# Altium footprint library Vowstar_Module.PcbLib: 57 footprints (part 1 of 4)
Each footprint in its own frame and in the unit in brackets; x right, y up, seen from the top. Pads: shape width x height; smd on the part's side, far side on the other; paste and mask are expansions set on the pad; w line width, h text height; cw(c..) or ccw(c..) is an arc to the next point about the centre after c.
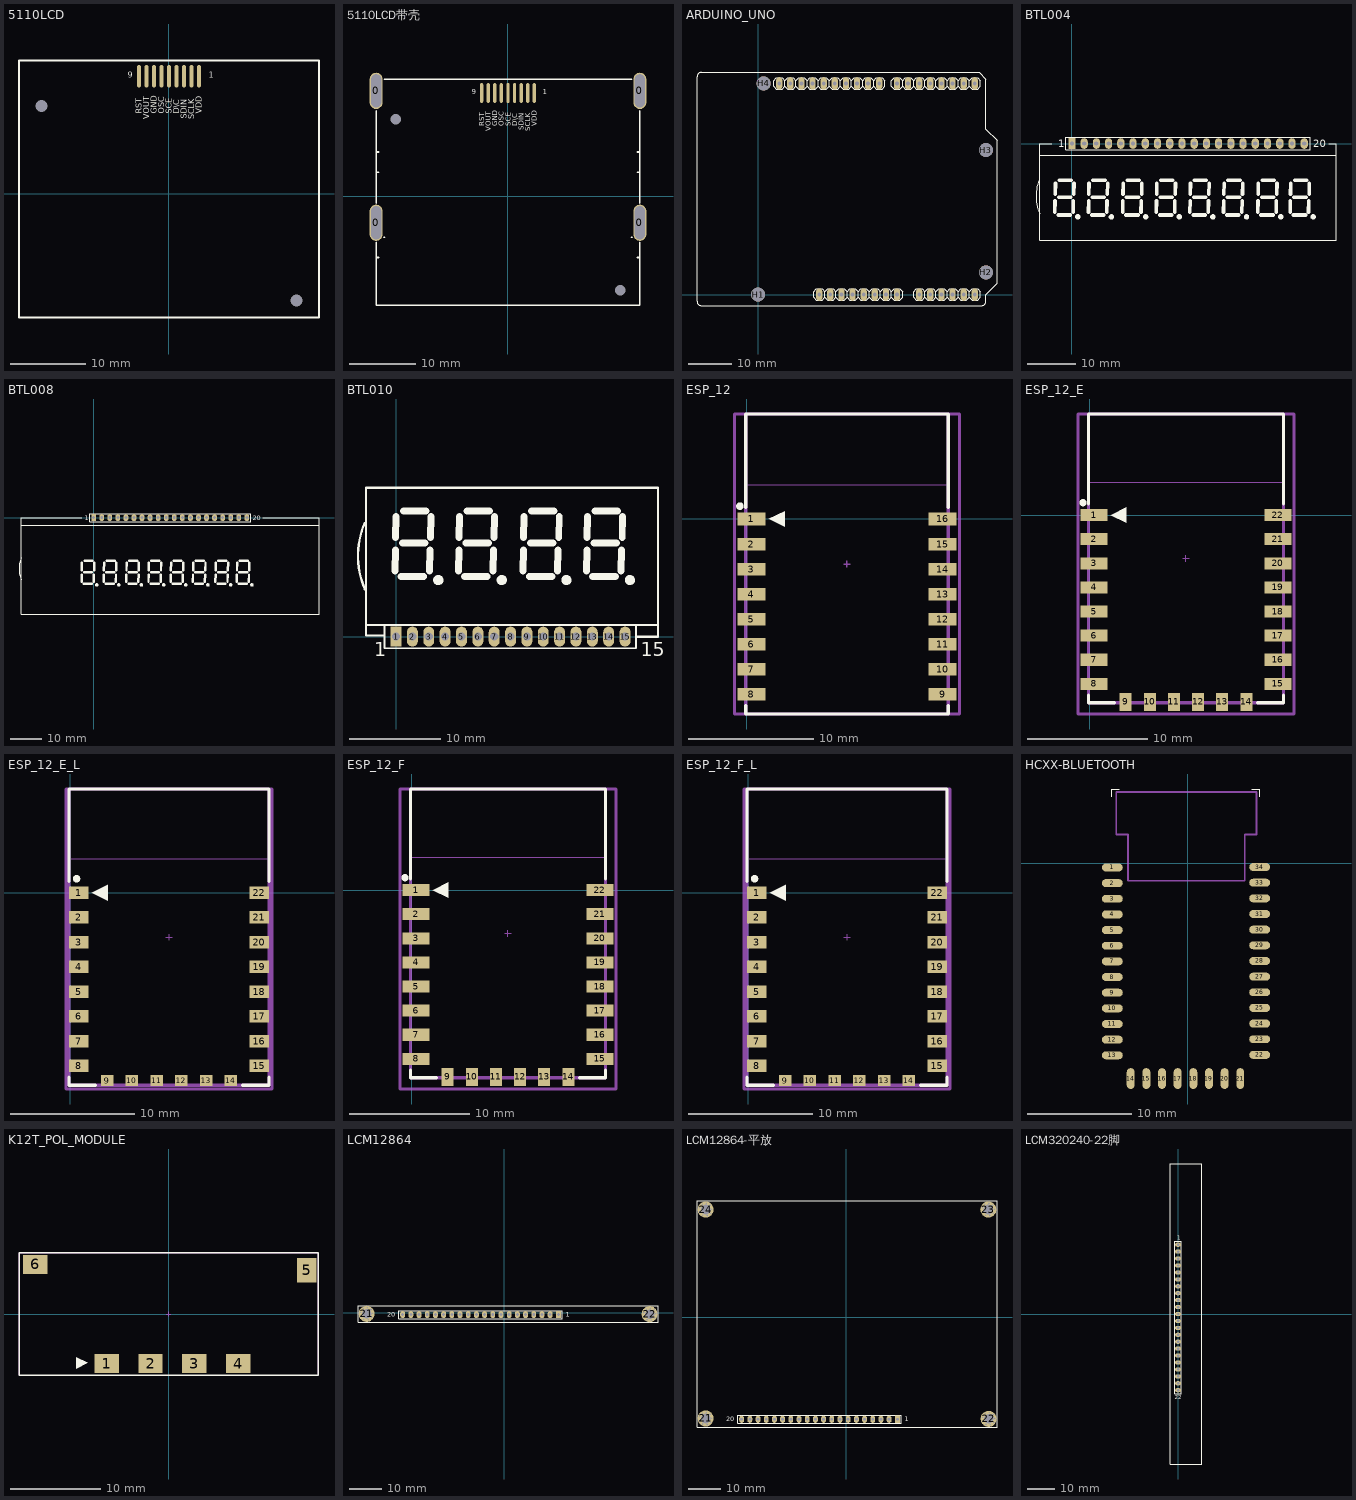
[diagram p0: the footprints below, top view; thin cyan lines are the x and y axes]

## 5110LCD [mm]
pads (11):
  round 0 on Mech1 hole 1.6: 0(-16.958,11.689) 0(17.06,-14.215)
  oval 0.5x3 smd: 1(4.06,15.685) 2(3.06,15.685) 3(2.06,15.685) 4(1.06,15.685) 5(0.06,15.685) 6(-0.94,15.685) 7(-1.94,15.685) 8(-2.94,15.685) 9(-3.94,15.685)
Top Overlay:
  lines w0.254: -19.94,-16.515 20.06,-16.515 20.06,17.785 -19.94,17.785 -19.94,-16.515
  text "9" at -5.461,15.494 h0.76
  text "1" at 5.334,15.494 h0.76
  text "RST" at -3.556,10.668 h0.76
  text "VOUT" at -2.556,9.906 h0.76
  text "GND" at -1.556,10.668 h0.76
  text "OSC" at -0.556,10.668 h0.76
  text "SCE" at 0.445,10.668 h0.76
  text "D\C" at 1.445,10.668 h0.76
  text "SDIN" at 2.445,10.033 h0.76
  text "SCLK" at 3.445,9.906 h0.76
  text "VDD" at 4.445,10.668 h0.76
3D body: height 2.8, standoff 0, extent -19.685,-16.256 19.812,17.526

## 5110LCD带壳 [mm]
pads (15):
  oval 2x5.5 hole 1.5 slot 5 at 90 deg: 0(-19.939,-3.998) 0(-19.939,16.002) 0(20.066,-3.998) 0(20.066,16.002)
  round 0 on Mech1 hole 1.6: 0(-16.958,11.689) 0(17.06,-14.215)
  oval 0.5x3 smd: 1(4.06,15.685) 2(3.06,15.685) 3(2.06,15.685) 4(1.06,15.685) 5(0.06,15.685) 6(-0.94,15.685) 7(-1.94,15.685) 8(-2.94,15.685) 9(-3.94,15.685)
Top Overlay:
  lines w0.254: -19.94,-6.985 -19.94,-16.515 20.06,-16.515 20.06,-6.985 ; -19.94,-1.016 -19.94,12.954 ; -19.939,-9.271 -19.558,-9.271 ; -19.939,3.683 -19.558,3.683 ; -19.939,6.731 -19.558,6.731 ; -18.796,-6.223 -18.669,-6.223 ; -18.669,17.78 18.796,17.78 ; 18.796,-6.223 18.923,-6.223 ; 19.685,-9.271 20.066,-9.271 ; 19.685,3.683 19.939,3.683 ; 19.685,6.731 19.939,6.731 ; 20.06,12.954 20.068,-1.016
  text "VDD" at 4.445,10.668 h0.76
  text "SCLK" at 3.445,9.906 h0.76
  text "SDIN" at 2.445,10.033 h0.76
  text "D\C" at 1.445,10.668 h0.76
  text "SCE" at 0.445,10.668 h0.76
  text "OSC" at -0.556,10.668 h0.76
  text "GND" at -1.556,10.668 h0.76
  text "VOUT" at -2.556,9.906 h0.76
  text "RST" at -3.556,10.668 h0.76
  text "1" at 5.334,15.494 h0.76
  text "9" at -5.461,15.494 h0.76
3D body: height 2.8, standoff 0, extent -19.685,-16.256 19.812,17.526

## ARDUINO_UNO [mil] "ARDUINO_UNO"
pads (36):
  oval 56x112 hole 34: AD1(1450,0) AD2(1550,0) AD3(1650,0) AD4(1750,0) AD5(1850,0) AD6(1950,0) IOH1(1090,1900) IOH2(990,1900) IOH3(890,1900) IOH4(790,1900) IOH5(690,1900) IOH6(590,1900) IOH7(490,1900) IOH8(390,1900) IOH9(290,1900) IOH10(190,1900) IOL1(1950,1900) IOL2(1850,1900) IOL3(1750,1900) IOL4(1650,1900) IOL5(1550,1900) IOL6(1450,1900) IOL7(1350,1900) IOL8(1250,1900) POW1(550,0) POW2(650,0) POW3(750,0) POW4(850,0) POW5(950,0) POW6(1050,0) POW7(1150,0) POW8(1250,0)
  round 126 hole 126: H1(0,0) H2(2050,200) H3(2050,1300) H4(50,1900)
Top Overlay:
  drawing of 240 lines, arcs and shapes, not listed

## BTL004 [mm] "BTL004"
height 2.8
pads (20):
  rect 1.5x2.2 hole 0.9: 1(0,0)
  oval 1.5x2.2 hole 0.9: 2(2.54,0) 3(5.08,0) 4(7.62,0) 5(10.16,0) 6(12.7,0) 7(15.24,0) 8(17.78,0) 9(20.32,0) 10(22.86,0) 11(25.4,0) 12(27.94,0) 13(30.48,0) 14(33.02,0) 15(35.56,0) 16(38.1,0) 17(40.64,0) 18(43.18,0) 19(45.72,0) 20(48.26,0)
Top Overlay:
  circle w1.016: c50.114,-15.24 r0.051
  circle w1.016: c43.383,-15.24 r0.051
  circle w1.016: c36.271,-15.24 r0.051
  circle w1.016: c29.286,-15.24 r0.051
  circle w1.016: c22.301,-15.24 r0.051
  circle w1.016: c15.316,-15.24 r0.051
  circle w1.016: c8.204,-15.24 r0.051
  circle w1.016: c1.219,-15.24 r0.051
  lines w0.2: -1.27,-1.27 49.53,-1.27 49.53,1.27 0.635,1.27 -1.27,1.27 -1.27,-1.27
  lines w0.254: -6.813,-7.52 ccw(c1.77,-10.929) -6.713,-14.58 ; -6.731,-2.413 54.864,-2.413 ; -4.191,0 -6.731,0 -6.731,-20.066 54.864,-20.066 54.864,0 53.34,0
  lines w0.762: -3.556,-14.224 -3.505,-11.938 ; -3.48,-10.541 -3.429,-8.255 ; -2.87,-14.859 -0.381,-14.859 ; -2.743,-11.176 -0.254,-11.176 ; -2.616,-7.62 -0.127,-7.62 ; 0.254,-14.224 0.305,-11.938 ; 0.381,-10.541 0.432,-8.255 ; 3.429,-14.224 3.48,-11.938 ; 3.505,-10.541 3.556,-8.255 ; 4.115,-14.859 6.604,-14.859 ; 4.242,-11.176 6.731,-11.176 ; 4.369,-7.62 6.858,-7.62 ; 7.239,-14.224 7.29,-11.938 ; 7.366,-10.541 7.417,-8.255 ; 10.541,-14.224 10.592,-11.938 ; 10.617,-10.541 10.668,-8.255 ; 11.227,-14.859 13.716,-14.859 ; 11.354,-11.176 13.843,-11.176 ; 11.481,-7.62 13.97,-7.62 ; 14.351,-14.224 14.402,-11.938 ; 14.478,-10.541 14.529,-8.255 ; 17.526,-14.224 17.577,-11.938 ; 17.602,-10.541 17.653,-8.255 ; 18.212,-14.859 20.701,-14.859 ; 18.339,-11.176 20.828,-11.176 ; 18.466,-7.62 20.955,-7.62 ; 21.336,-14.224 21.387,-11.938 ; 21.463,-10.541 21.514,-8.255 ; 24.511,-14.224 24.562,-11.938 ; 24.587,-10.541 24.638,-8.255 ; 25.197,-14.859 27.686,-14.859 ; 25.324,-11.176 27.813,-11.176 ; 25.451,-7.62 27.94,-7.62 ; 28.321,-14.224 28.372,-11.938 ; 28.448,-10.541 28.499,-8.255 ; 31.496,-14.224 31.547,-11.938 ; 31.572,-10.541 31.623,-8.255 ; 32.182,-14.859 34.671,-14.859 ; 32.309,-11.176 34.798,-11.176 ; 32.436,-7.62 34.925,-7.62 ; 35.306,-14.224 35.357,-11.938 ; 35.433,-10.541 35.484,-8.255 ; 38.608,-14.224 38.659,-11.938 ; 38.684,-10.541 38.735,-8.255 ; 39.294,-14.859 41.783,-14.859 ; 39.421,-11.176 41.91,-11.176 ; 39.548,-7.62 42.037,-7.62 ; 42.418,-14.224 42.469,-11.938 ; 42.545,-10.541 42.596,-8.255 ; 45.339,-14.224 45.39,-11.938 ; 45.415,-10.541 45.466,-8.255 ; 46.025,-14.859 48.514,-14.859 ; 46.152,-11.176 48.641,-11.176 ; 46.279,-7.62 48.768,-7.62 ; 49.149,-14.224 49.2,-11.938 ; 49.276,-10.541 49.327,-8.255
  text "1" at -2.794,-0.762 h1.52
  text "20" at 50.165,-0.762 h1.52
3D body: height 2.4, standoff 0.4, extent -7.493,-14.224 -6.731,-7.747
3D body: height 2, standoff 0, extent -6.731,-2.413 54.864,0
3D body: height 2.8, standoff 0, extent -6.731,-20.193 54.864,-2.413

## BTL008 [mm]
pads (20):
  rect 1.5x2.2 hole 0.9: 1(0,0)
  oval 1.5x2.2 hole 0.9: 2(2.54,0) 3(5.08,0) 4(7.62,0) 5(10.16,0) 6(12.7,0) 7(15.24,0) 8(17.78,0) 9(20.32,0) 10(22.86,0) 11(25.4,0) 12(27.94,0) 13(30.48,0) 14(33.02,0) 15(35.56,0) 16(38.1,0) 17(40.64,0) 18(43.18,0) 19(45.72,0) 20(48.26,0)
Top Overlay:
  circle w1.016: c49.86,-21.209 r0.051
  circle w1.016: c43.129,-21.209 r0.051
  circle w1.016: c36.017,-21.209 r0.051
  circle w1.016: c29.032,-21.209 r0.051
  circle w1.016: c22.047,-21.209 r0.051
  circle w1.016: c15.062,-21.209 r0.051
  circle w1.016: c7.95,-21.209 r0.051
  circle w1.016: c0.965,-21.209 r0.051
  lines w0.2: -1.27,-1.27 49.53,-1.27 49.53,1.27 0.635,1.27 -1.27,1.27 -1.27,-1.27
  lines w0.254: -22.86,-12.573 ccw(c-14.277,-15.982) -22.76,-19.633 ; -22.733,-2.413 70.866,-2.413 ; -3.81,0 -22.733,0 -22.733,-30.48 70.993,-30.48 70.993,0 53.34,0
  lines w0.762: -3.81,-20.193 -3.759,-17.907 ; -3.734,-16.51 -3.683,-14.224 ; -3.124,-20.828 -0.635,-20.828 ; -2.997,-17.145 -0.508,-17.145 ; -2.87,-13.589 -0.381,-13.589 ; 0,-20.193 0.051,-17.907 ; 0.127,-16.51 0.178,-14.224 ; 3.175,-20.193 3.226,-17.907 ; 3.251,-16.51 3.302,-14.224 ; 3.861,-20.828 6.35,-20.828 ; 3.988,-17.145 6.477,-17.145 ; 4.115,-13.589 6.604,-13.589 ; 6.985,-20.193 7.036,-17.907 ; 7.112,-16.51 7.163,-14.224 ; 10.287,-20.193 10.338,-17.907 ; 10.363,-16.51 10.414,-14.224 ; 10.973,-20.828 13.462,-20.828 ; 11.1,-17.145 13.589,-17.145 ; 11.227,-13.589 13.716,-13.589 ; 14.097,-20.193 14.148,-17.907 ; 14.224,-16.51 14.275,-14.224 ; 17.272,-20.193 17.323,-17.907 ; 17.348,-16.51 17.399,-14.224 ; 17.958,-20.828 20.447,-20.828 ; 18.085,-17.145 20.574,-17.145 ; 18.212,-13.589 20.701,-13.589 ; 21.082,-20.193 21.133,-17.907 ; 21.209,-16.51 21.26,-14.224 ; 24.257,-20.193 24.308,-17.907 ; 24.333,-16.51 24.384,-14.224 ; 24.943,-20.828 27.432,-20.828 ; 25.07,-17.145 27.559,-17.145 ; 25.197,-13.589 27.686,-13.589 ; 28.067,-20.193 28.118,-17.907 ; 28.194,-16.51 28.245,-14.224 ; 31.242,-20.193 31.293,-17.907 ; 31.318,-16.51 31.369,-14.224 ; 31.928,-20.828 34.417,-20.828 ; 32.055,-17.145 34.544,-17.145 ; 32.182,-13.589 34.671,-13.589 ; 35.052,-20.193 35.103,-17.907 ; 35.179,-16.51 35.23,-14.224 ; 38.354,-20.193 38.405,-17.907 ; 38.43,-16.51 38.481,-14.224 ; 39.04,-20.828 41.529,-20.828 ; 39.167,-17.145 41.656,-17.145 ; 39.294,-13.589 41.783,-13.589 ; 42.164,-20.193 42.215,-17.907 ; 42.291,-16.51 42.342,-14.224 ; 45.085,-20.193 45.136,-17.907 ; 45.161,-16.51 45.212,-14.224 ; 45.771,-20.828 48.26,-20.828 ; 45.898,-17.145 48.387,-17.145 ; 46.025,-13.589 48.514,-13.589 ; 48.895,-20.193 48.946,-17.907 ; 49.022,-16.51 49.073,-14.224
  text "1" at -2.794,-0.762 h1.52
  text "20" at 50.165,-0.762 h1.52
3D body: height 2.4, standoff 0.4, extent -23.368,-19.812 -22.606,-13.335
3D body: height 2, standoff 0, extent -22.606,-2.413 70.993,0
3D body: height 2.8, standoff 0, extent -22.733,-30.449 70.739,-2.286

## BTL010 [mm] "BTL010"
height 2.8
pads (15):
  rect 1.2x2.2 hole 0.9: 1(0,0)
  oval 1.2x2.2 hole 0.9: 2(1.8,0) 3(3.6,0) 4(5.4,0) 5(7.2,0) 6(9,0) 7(10.8,0) 8(12.6,0) 9(14.4,0) 10(16.2,0) 11(18,0) 12(19.8,0) 13(21.6,0) 14(23.4,0) 15(25.2,0)
Top Overlay:
  circle w1.016: c4.648,6.223 r0.051
  circle w1.016: c11.633,6.223 r0.051
  circle w1.016: c18.745,6.223 r0.051
  circle w1.016: c25.73,6.223 r0.051
  lines w0.2: -1.27,-1.27 -1.27,1.27 0.635,1.27 26.416,1.27 26.416,-1.27 -1.27,-1.27
  lines w0.254: -3.452,12.51 ccw(c5.072,8.883) -3.437,5.221 ; -3.302,1.397 -3.302,0.127 -1.27,0.127 ; 26.543,0 28.829,0 28.829,1.27 ; 28.829,1.27 -3.302,1.27 -3.302,16.383 28.829,16.383 28.829,1.27
  lines w0.762: -0.127,7.239 -0.076,9.525 ; -0.051,10.922 0,13.208 ; 0.559,6.604 3.048,6.604 ; 0.686,10.287 3.175,10.287 ; 0.813,13.843 3.302,13.843 ; 3.683,7.239 3.734,9.525 ; 3.81,10.922 3.861,13.208 ; 6.858,7.239 6.909,9.525 ; 6.934,10.922 6.985,13.208 ; 7.544,6.604 10.033,6.604 ; 7.671,10.287 10.16,10.287 ; 7.798,13.843 10.287,13.843 ; 10.668,7.239 10.719,9.525 ; 10.795,10.922 10.846,13.208 ; 13.97,7.239 14.021,9.525 ; 14.046,10.922 14.097,13.208 ; 14.656,6.604 17.145,6.604 ; 14.783,10.287 17.272,10.287 ; 14.91,13.843 17.399,13.843 ; 17.78,7.239 17.831,9.525 ; 17.907,10.922 17.958,13.208 ; 20.955,7.239 21.006,9.525 ; 21.031,10.922 21.082,13.208 ; 21.641,6.604 24.13,6.604 ; 21.768,10.287 24.257,10.287 ; 21.895,13.843 24.384,13.843 ; 24.765,7.239 24.816,9.525 ; 24.892,10.922 24.943,13.208
  text "15" at 26.924,-2.159 h1.52
  text "1" at -2.413,-2.159 h1.52
3D body: height 2.8, standoff 0, extent -3.302,1.27 28.829,16.383
3D body: height 2.4, standoff 0.4, extent -4.191,5.588 -3.429,12.065
3D body: height 2, standoff 0, extent -3.429,0 28.829,1.333

## ESP_12 [mm] "ESP-12 Wi-Fi Module by AI-Thinker"
height 3.2
pads (16):
  rect 2.25x1 smd: 1(0.375,0) 2(0.375,-2) 3(0.375,-4) 4(0.375,-6) 5(0.375,-8) 6(0.375,-10) 7(0.375,-12) 8(0.375,-14) 9(15.625,-14) 10(15.625,-12) 11(15.625,-10) 12(15.625,-8) 13(15.625,-6) 14(15.625,-4) 15(15.625,-2) 16(15.625,0)
Top Overlay:
  circle w0.3: c-0.55,1.025 r0.15
  region: 1.77,0 3.04,-0.635 3.04,0.635
  lines w0.254: -0.084,-14.916 -0.084,-15.568 16.084,-15.568 16.084,-14.916 ; -0.084,0.916 -0.084,8.371 16.084,8.371 16.084,0.916
Mechanical 13:
  lines w0.051: -0.127,2.727 -0.127,8.382 16.129,8.382 16.129,2.727 -0.127,2.727
  lines w0.254: -0.084,-15.568 16.084,-15.568 16.084,8.371 -0.084,8.371 -0.084,-15.568
  text "CUTOUT POLYGON" at 0.127,7.366 h0.25
  text "ANTENNA AREA" at 0.127,7.874 h0.25
Mechanical 15:
  lines w0.1: 7.746,-3.598 8.254,-3.598 ; 8,-3.852 8,-3.344
  lines w0.254: -0.975,-15.568 -0.975,8.371 16.975,8.371 16.975,-15.568 -0.975,-15.568
3D body "ESP_12_E.STEP": height 2.75, standoff 0.04, extent 0.001,-15.491 16.001,8.509

## ESP_12_E [mm] "ESP-12 Wi-Fi Module by AI-Thinker"
height 3.2
pads (22):
  rect 2.25x1 smd: 1(0.375,0) 2(0.375,-2) 3(0.375,-4) 4(0.375,-6) 5(0.375,-8) 6(0.375,-10) 7(0.375,-12) 8(0.375,-14) 15(15.625,-14) 16(15.625,-12) 17(15.625,-10) 18(15.625,-8) 19(15.625,-6) 20(15.625,-4) 21(15.625,-2) 22(15.625,0)
  rect 1x1.5 smd: 9(3,-15.5) 10(5,-15.5) 11(7,-15.5) 12(9,-15.5) 13(11,-15.5) 14(13,-15.5)
Top Overlay:
  circle w0.3: c-0.55,1.025 r0.15
  region: 1.77,0 3.04,-0.635 3.04,0.635
  lines w0.254: -0.084,-14.916 -0.084,-15.568 2.068,-15.568 ; -0.084,0.916 -0.084,8.371 16.084,8.371 16.084,0.916 ; 13.932,-15.568 16.084,-15.568 16.084,-14.916
Mechanical 13:
  lines w0.051: -0.127,2.727 16.129,2.727 16.129,8.382 -0.127,8.382 -0.127,2.727
  lines w0.254: -0.084,-15.568 -0.084,8.371 16.084,8.371 16.084,-15.568 -0.084,-15.568
  text "ANTENNA AREA" at 0.127,7.874 h0.25
  text "CUTOUT POLYGON" at 0.127,7.366 h0.25
Mechanical 15:
  lines w0.1: 7.746,-3.598 8.254,-3.598 ; 8,-3.852 8,-3.344
  lines w0.254: -0.975,-16.5 16.975,-16.5 16.975,8.371 -0.975,8.371 -0.975,-16.5
3D body "ESP_12_E.STEP": height 2.75, standoff 0.04, extent 0.001,-15.491 16.001,8.509

## ESP_12_E_L [mm] "ESP-12 Wi-Fi Module by AI-Thinker"
height 3.2
pads (22):
  rect 1.6x1 smd: 1(0.7,0) 2(0.7,-2) 3(0.7,-4) 4(0.7,-6) 5(0.7,-8) 6(0.7,-10) 7(0.7,-12) 8(0.7,-14) 15(15.3,-14) 16(15.3,-12) 17(15.3,-10) 18(15.3,-8) 19(15.3,-6) 20(15.3,-4) 21(15.3,-2) 22(15.3,0)
  rect 1x0.9 smd: 9(3,-15.2) 10(5,-15.2) 11(7,-15.2) 12(9,-15.2) 13(11,-15.2) 14(13,-15.2)
Top Overlay:
  circle w0.3: c0.525,1.125 r0.15
  region: 1.77,0 3.04,-0.635 3.04,0.635
  lines w0.254: -0.084,-14.916 -0.084,-15.568 2.068,-15.568 ; -0.084,0.916 -0.084,8.371 16.084,8.371 16.084,0.916 ; 13.932,-15.568 16.084,-15.568 16.084,-14.916
Mechanical 13:
  lines w0.051: -0.127,2.727 16.129,2.727 16.129,8.382 -0.127,8.382 -0.127,2.727
  lines w0.254: -0.084,-15.568 -0.084,8.371 16.084,8.371 16.084,-15.568 -0.084,-15.568
  text "ANTENNA AREA" at 0.127,7.874 h0.25
  text "CUTOUT POLYGON" at 0.127,7.366 h0.25
Mechanical 15:
  lines w0.1: 7.746,-3.598 8.254,-3.598 ; 8,-3.852 8,-3.344
  lines w0.254: -0.325,-15.875 16.325,-15.875 16.325,8.371 -0.325,8.371 -0.325,-15.875
3D body "ESP_12_E.STEP": height 2.75, standoff 0.04, extent 0.001,-15.491 16.001,8.509

## ESP_12_F [mm] "ESP-12 Wi-Fi Module by AI-Thinker"
height 3.2
pads (22):
  rect 2.25x1 smd: 1(0.375,0) 2(0.375,-2) 3(0.375,-4) 4(0.375,-6) 5(0.375,-8) 6(0.375,-10) 7(0.375,-12) 8(0.375,-14) 15(15.625,-14) 16(15.625,-12) 17(15.625,-10) 18(15.625,-8) 19(15.625,-6) 20(15.625,-4) 21(15.625,-2) 22(15.625,0)
  rect 1x1.5 smd: 9(3,-15.5) 10(5,-15.5) 11(7,-15.5) 12(9,-15.5) 13(11,-15.5) 14(13,-15.5)
Top Overlay:
  circle w0.3: c-0.55,1.025 r0.15
  region: 1.77,0 3.04,-0.635 3.04,0.635
  lines w0.254: -0.084,-14.916 -0.084,-15.568 2.068,-15.568 ; -0.084,0.916 -0.084,8.371 16.084,8.371 16.084,0.916 ; 13.932,-15.568 16.084,-15.568 16.084,-14.916
Mechanical 13:
  lines w0.051: -0.127,2.727 16.129,2.727 16.129,8.382 -0.127,8.382 -0.127,2.727
  lines w0.254: -0.084,-15.568 -0.084,8.371 16.084,8.371 16.084,-15.568 -0.084,-15.568
  text "ANTENNA AREA" at 0.127,7.874 h0.25
  text "CUTOUT POLYGON" at 0.127,7.366 h0.25
Mechanical 15:
  lines w0.1: 7.746,-3.598 8.254,-3.598 ; 8,-3.852 8,-3.344
  lines w0.254: -0.975,-16.5 16.975,-16.5 16.975,8.371 -0.975,8.371 -0.975,-16.5
3D body "ESP_12_F.STEP": height 2.65, standoff -0.06, extent 0,-15.581 16,8.419

## ESP_12_F_L [mm] "ESP-12 Wi-Fi Module by AI-Thinker"
height 3.2
pads (22):
  rect 1.6x1 smd: 1(0.7,0) 2(0.7,-2) 3(0.7,-4) 4(0.7,-6) 5(0.7,-8) 6(0.7,-10) 7(0.7,-12) 8(0.7,-14) 15(15.3,-14) 16(15.3,-12) 17(15.3,-10) 18(15.3,-8) 19(15.3,-6) 20(15.3,-4) 21(15.3,-2) 22(15.3,0)
  rect 1x0.9 smd: 9(3,-15.2) 10(5,-15.2) 11(7,-15.2) 12(9,-15.2) 13(11,-15.2) 14(13,-15.2)
Top Overlay:
  circle w0.3: c0.525,1.125 r0.15
  region: 1.77,0 3.04,-0.635 3.04,0.635
  lines w0.254: -0.084,-14.916 -0.084,-15.568 2.068,-15.568 ; -0.084,0.916 -0.084,8.371 16.084,8.371 16.084,0.916 ; 13.932,-15.568 16.084,-15.568 16.084,-14.916
Mechanical 13:
  lines w0.051: -0.127,2.727 16.129,2.727 16.129,8.382 -0.127,8.382 -0.127,2.727
  lines w0.254: -0.084,-15.568 -0.084,8.371 16.084,8.371 16.084,-15.568 -0.084,-15.568
  text "ANTENNA AREA" at 0.127,7.874 h0.25
  text "CUTOUT POLYGON" at 0.127,7.366 h0.25
Mechanical 15:
  lines w0.1: 7.746,-3.598 8.254,-3.598 ; 8,-3.852 8,-3.344
  lines w0.254: -0.325,-15.875 16.325,-15.875 16.325,8.371 -0.325,8.371 -0.325,-15.875
3D body "ESP_12_F.STEP": height 2.65, standoff -0.06, extent 0,-15.581 16,8.419

## HCXX-BLUETOOTH [mm] "HCXX-BLUETOOTH"
pads (34):
  oval 2x0.76 smd: 1(-7.229,-0.381) 2(-7.229,-1.881) 3(-7.229,-3.381) 4(-7.229,-4.881) 5(-7.229,-6.381) 6(-7.229,-7.881) 7(-7.229,-9.381) 8(-7.229,-10.881) 9(-7.229,-12.381) 10(-7.229,-13.881) 11(-7.229,-15.381) 12(-7.229,-16.881) 13(-7.229,-18.381) 22(6.891,-18.341) 23(6.891,-16.841) 24(6.891,-15.341) 25(6.891,-13.841) 26(6.891,-12.341) 27(6.891,-10.841) 28(6.891,-9.341) 29(6.891,-7.841) 30(6.891,-6.341) 31(6.891,-4.841) 32(6.891,-3.341) 33(6.891,-1.841) 34(6.891,-0.341)
  oval 0.76x2 smd: 14(-5.469,-20.611) 15(-3.969,-20.611) 16(-2.469,-20.611) 17(-0.969,-20.611) 18(0.531,-20.611) 19(2.031,-20.611) 20(3.531,-20.611) 21(5.031,-20.611)
Top Overlay:
  lines w0.1: -7.299,6.389 -7.299,7.139 -6.549,7.139 ; 6.151,7.139 6.901,7.139 6.901,6.389
Mechanical 13:
  lines w0.178: -6.858,2.794 -6.858,6.858 6.604,6.858 6.604,2.794 5.461,2.794 5.461,-1.651 -5.715,-1.651 -5.715,2.794 -6.858,2.794

## K12T_POL_MODULE [mm] "Non-isolated voltage regulator single 10/16A output, POL module power supply"
height 8.3
pads (6):
  rect 2.7x2.1 smd: 1(-6.82,-5.47) 2(-1.99,-5.47) 3(2.84,-5.47) 4(7.67,-5.47) 6(-14.7,5.47)
  rect 2.1x2.7 smd: 5(15.25,4.81)
Top Overlay:
  region: -8.89,-5.397 -10.16,-4.763 -10.16,-6.032
  lines w0.152: -16.5,-6.75 16.5,-6.75 16.5,6.75 -16.5,6.75 -16.5,-6.75
Mechanical 13:
  lines w0.1: -16.5,-6.75 16.5,-6.75 16.5,6.75 -16.5,6.75 -16.5,-6.75
Mechanical 15:
  lines w0.1: -0.25,0 0.25,0 ; 0,-0.25 0,0.25 ; -16.5,-6.75 -16.5,6.75 16.5,6.75 16.5,-6.75 -16.5,-6.75
3D body "K12T-16A.STEP": height 8.3, standoff 0, extent -16.5,-6.75 16.5,6.75

## LCM12864 [mm] "LCM12864"
pads (22):
  rect 1.5x2.2 hole 0.9: 1(16.764,-0.508)
  oval 1.5x2.2 hole 0.9: 2(14.224,-0.508) 3(11.684,-0.508) 4(9.144,-0.508) 5(6.604,-0.508) 6(4.064,-0.508) 7(1.524,-0.508) 8(-1.016,-0.508) 9(-3.556,-0.508) 10(-6.096,-0.508) 11(-8.636,-0.508) 12(-11.176,-0.508) 13(-13.716,-0.508) 14(-16.256,-0.508) 15(-18.796,-0.508) 16(-21.336,-0.508) 17(-23.876,-0.508) 18(-26.416,-0.508) 19(-28.956,-0.508) 20(-31.496,-0.508)
  round 5 hole 3: 21(-42.672,-0.254) 22(45.085,-0.381)
via 46.626,-1.508 diameter 0.7 hole 0.5
via 45.541,-2.235 diameter 0.7 hole 0.5
via 44.242,-2.094 diameter 0.7 hole 0.5
via 43.338,-1.152 diameter 0.7 hole 0.5
via 43.251,0.151 diameter 0.7 hole 0.5
via 44.023,1.205 diameter 0.7 hole 0.5
via 45.291,1.517 diameter 0.7 hole 0.5
via 46.463,0.941 diameter 0.7 hole 0.5
via 46.99,-0.254 diameter 0.7 hole 0.5
via -40.767,-0.127 diameter 0.7 hole 0.5
via -41.294,1.068 diameter 0.7 hole 0.5
via -42.466,1.644 diameter 0.7 hole 0.5
via -43.734,1.332 diameter 0.7 hole 0.5
via -44.506,0.278 diameter 0.7 hole 0.5
via -44.419,-1.025 diameter 0.7 hole 0.5
via -43.515,-1.967 diameter 0.7 hole 0.5
via -42.216,-2.108 diameter 0.7 hole 0.5
via -41.131,-1.381 diameter 0.7 hole 0.5
Top Overlay:
  lines w0.2: -32.766,-1.778 -32.766,0.762 18.034,0.762 18.034,-1.778 16.129,-1.778 -32.766,-1.778
  lines w0.254: -45.339,-2.921 -45.339,2.286 47.661,2.286 47.661,-2.921 -45.339,-2.921
  text "1" at 19.05,-1.143 h1.52
  text "20" at -36.195,-1.143 h1.52

## LCM12864-平放 [mm] "LCM12864-平放"
pads (24):
  rect 1.5x2.2 hole 0.9: 1(15.875,-31.623)
  oval 1.5x2.2 hole 0.9: 2(13.335,-31.623) 3(10.795,-31.623) 4(8.255,-31.623) 5(5.715,-31.623) 6(3.175,-31.623) 7(0.635,-31.623) 8(-1.905,-31.623) 9(-4.445,-31.623) 10(-6.985,-31.623) 11(-9.525,-31.623) 12(-12.065,-31.623) 13(-14.605,-31.623) 14(-17.145,-31.623) 15(-19.685,-31.623) 16(-22.225,-31.623) 17(-24.765,-31.623) 18(-27.305,-31.623) 19(-29.845,-31.623) 20(-32.385,-31.623)
  round 5 hole 3: 21(-43.561,-31.369) 22(44.196,-31.496) 23(44.069,33.401) 24(-43.561,33.401)
via -42.02,-32.496 diameter 0.7 hole 0.5
via -43.105,-33.223 diameter 0.7 hole 0.5
via -44.404,-33.082 diameter 0.7 hole 0.5
via -45.308,-32.14 diameter 0.7 hole 0.5
via -45.395,-30.837 diameter 0.7 hole 0.5
via -44.623,-29.783 diameter 0.7 hole 0.5
via -43.355,-29.471 diameter 0.7 hole 0.5
via -42.183,-30.047 diameter 0.7 hole 0.5
via -41.656,-31.242 diameter 0.7 hole 0.5
via 46.101,-31.369 diameter 0.7 hole 0.5
via 45.574,-30.174 diameter 0.7 hole 0.5
via 44.402,-29.598 diameter 0.7 hole 0.5
via 43.134,-29.91 diameter 0.7 hole 0.5
via 42.362,-30.964 diameter 0.7 hole 0.5
via 42.449,-32.267 diameter 0.7 hole 0.5
via 43.353,-33.209 diameter 0.7 hole 0.5
via 44.652,-33.35 diameter 0.7 hole 0.5
via 45.737,-32.623 diameter 0.7 hole 0.5
via 45.974,33.528 diameter 0.7 hole 0.5
via 45.447,34.723 diameter 0.7 hole 0.5
via 44.275,35.299 diameter 0.7 hole 0.5
via 43.007,34.987 diameter 0.7 hole 0.5
via 42.235,33.933 diameter 0.7 hole 0.5
via 42.322,32.63 diameter 0.7 hole 0.5
via 43.226,31.688 diameter 0.7 hole 0.5
via 44.525,31.547 diameter 0.7 hole 0.5
via 45.61,32.274 diameter 0.7 hole 0.5
via -41.656,33.528 diameter 0.7 hole 0.5
via -42.183,34.723 diameter 0.7 hole 0.5
via -43.355,35.299 diameter 0.7 hole 0.5
via -44.623,34.987 diameter 0.7 hole 0.5
via -45.395,33.933 diameter 0.7 hole 0.5
via -45.308,32.63 diameter 0.7 hole 0.5
via -44.404,31.688 diameter 0.7 hole 0.5
via -43.105,31.547 diameter 0.7 hole 0.5
via -42.02,32.274 diameter 0.7 hole 0.5
Top Overlay:
  lines w0.2: -33.655,-32.893 15.24,-32.893 17.145,-32.893 17.145,-30.353 -33.655,-30.353 -33.655,-32.893
  lines w0.254: -46.228,-34.036 46.772,-34.036 46.772,36.068 -46.228,36.068 -46.228,-34.036
  text "20" at -37.084,-32.258 h1.52
  text "1" at 18.161,-32.258 h1.52

## LCM320240-22脚 [mm] "LCM320240-22脚"
height 7.62
pads (22):
  oval 2.2x1.5 hole 0.9: 1(0,25.4) 2(0,22.86) 3(0,20.32) 4(0,17.78) 5(0,15.24) 6(0,12.7) 7(0,10.16) 8(0,7.62) 9(0,5.08) 10(0,2.54) 11(0,0) 12(0,-2.54) 13(0,-5.08) 14(0,-7.62) 15(0,-10.16) 16(0,-12.7) 17(0,-15.24) 18(0,-17.78) 19(0,-20.32) 20(0,-22.86) 21(0,-25.4) 22(0,-27.94)
Top Overlay:
  lines w0.2: -1.27,-29.21 1.27,-29.21 1.27,26.67 -1.27,26.67 -1.27,-29.21
  lines w0.254: -2.794,-54.991 8.636,-54.991 8.636,54.991 -2.794,54.991 -2.794,-54.991
  text "1" at -0.254,27.178 h1.52
  text "22" at -1.143,-31.242 h1.52